# Altium footprint library Resistors_SMD_IPC-SM-782.PcbLib: 200 footprints (part 7 of 13)
Each footprint in its own frame and in the unit in brackets; x right, y up, seen from the top. Pads: shape width x height; smd on the part's side, far side on the other; paste and mask are expansions set on the pad; w line width, h text height; cw(c..) or ccw(c..) is an arc to the next point about the centre after c.
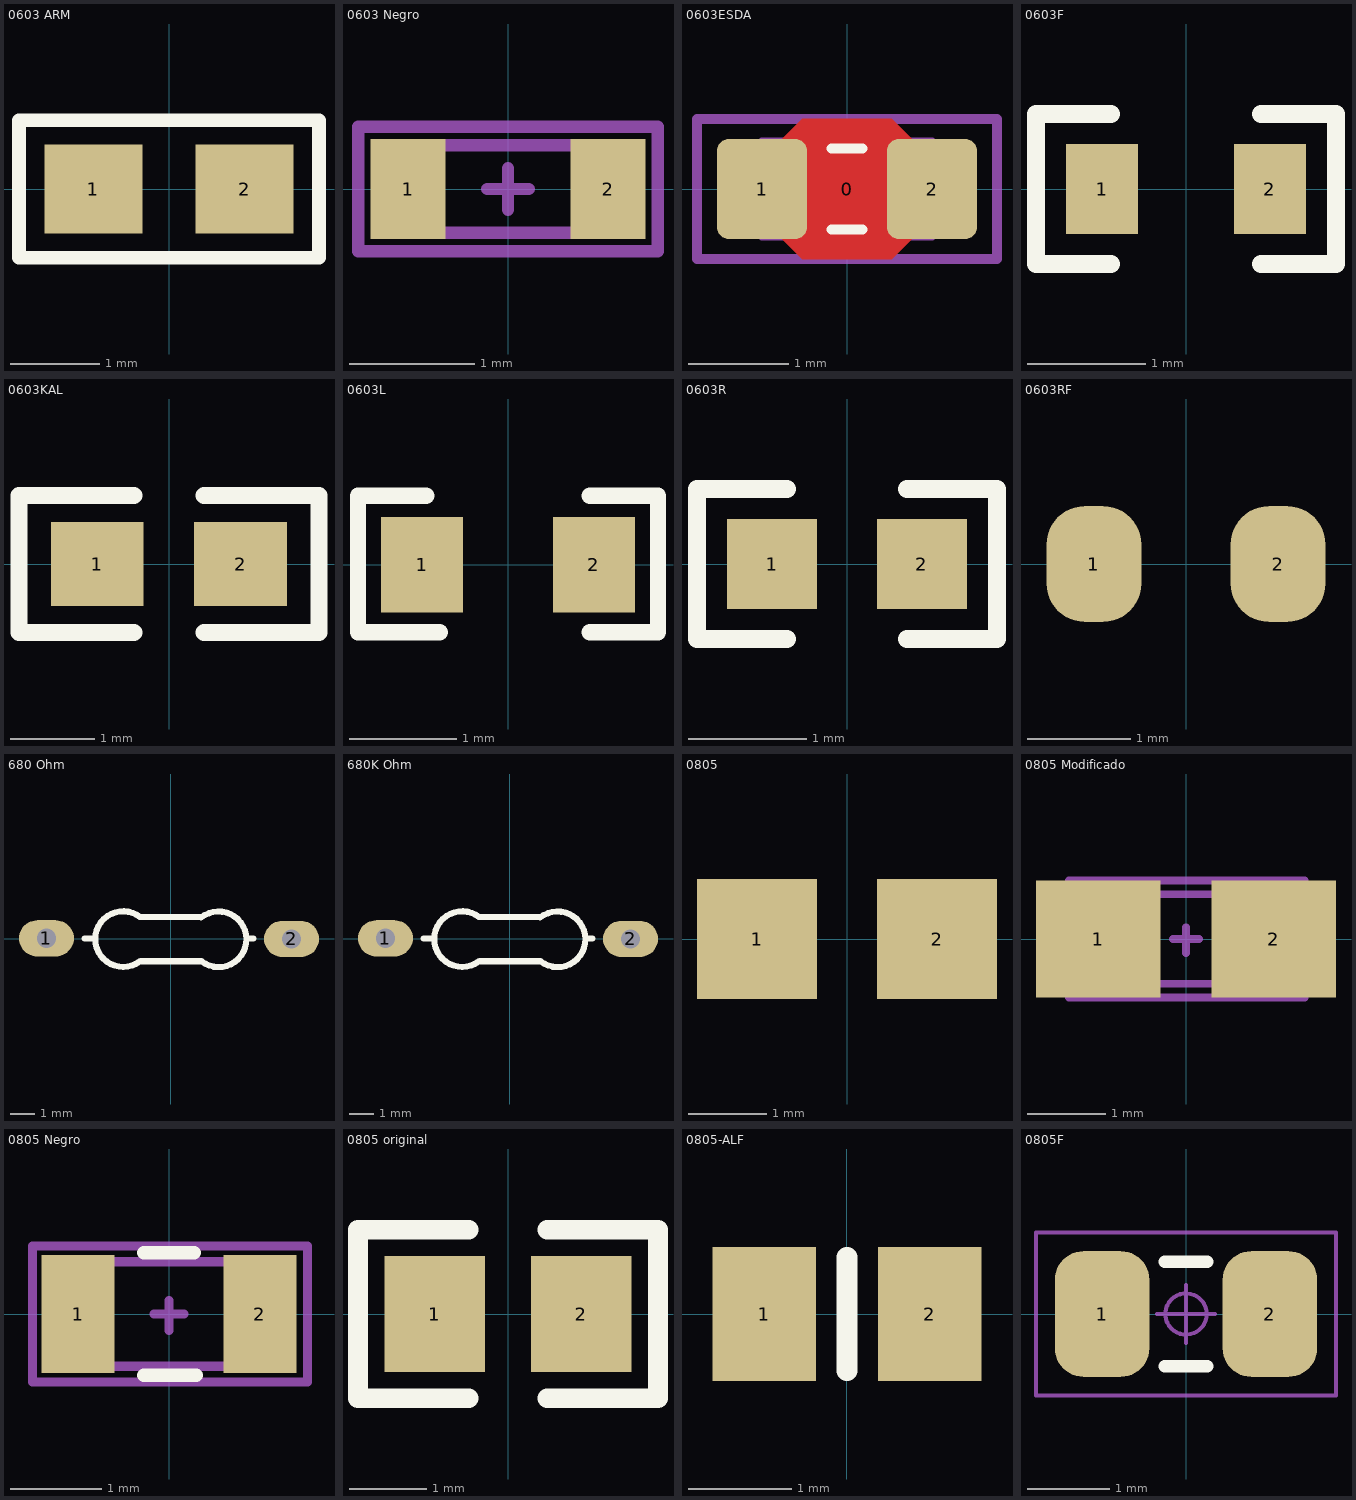
[diagram p6: the footprints below, top view; thin cyan lines are the x and y axes]

## 0603 ARM [mm]
pads (2):
  rect 1.1x1 smd: 1(-0.85,0) 2(0.85,0)
Top Overlay:
  lines w0.152: -1.684,-0.771 1.684,-0.771 1.684,0.771 -1.684,0.771 -1.684,-0.771
3D body "SW3DPS-RESISTOR 0603-DEFAULT.STEP": height 0.48, standoff -0.03, extent -0.8,-0.432 0.8,0.428

## 0603 Negro [mm] "Chip Resistor, Empaque 0603"
height 0.3
pads (2):
  rect 0.6x0.8 smd: 1(-0.8,0) 2(0.8,0)
Mechanical 13:
  lines w0.1: -0.8,-0.35 0.8,-0.35 0.8,0.35 -0.8,0.35 -0.8,-0.35
Mechanical 15:
  lines w0.1: -0.165,0 0.165,0 ; 0,-0.165 0,0.165 ; -1.2,-0.5 1.2,-0.5 1.2,0.5 -1.2,0.5 -1.2,-0.5
3D body "0603 SMD Resistor.STEP": height 0.3, standoff 0, extent -0.8,-0.4 0.8,0.4

## 0603ESDA [mm] "Chip ESD suppressor, Body 1.6x0.8mm, 0603, IPC Medium Density"
height 0.8
pads (3):
  round 0.254 on Mech15: 0(0,0)
  rrect25% 0.9x1 smd: 1(-0.85,0) 2(0.85,0)
Top Layer:
  pour cut-out: -0.65,0.5 -0.45,0.7 0.45,0.7 0.65,0.5 0.65,-0.5 0.45,-0.7 -0.45,-0.7 -0.65,-0.5
Top Overlay:
  lines w0.102: -0.152,-0.406 0.152,-0.406 ; -0.152,0.406 0.152,0.406
Mechanical 13:
  lines w0.076: -0.85,-0.475 -0.85,0.475 0.85,0.475 0.85,-0.475 -0.85,-0.475
Mechanical 15:
  lines w0.1: -1.5,-0.7 -1.5,0.7 1.5,0.7 1.5,-0.7 -1.5,-0.7
3D body "ESD Suppressor 0603 SMD.STEP": height 0.79, standoff -0.01, extent -0.85,-0.45 0.85,0.45

## 0603F [mil]
pads (2):
  rect 24x30 smd: 1(-28,0) 2(28,0)
Top Overlay:
  lines w6: -25,-25 -50,-25 -50,25 -25,25 ; 25,-25 50,-25 50,25 25,25
3D body "User Library-V0603HD.STEP": height 35.43, standoff 0, extent -31.49,-15.75 31.51,15.75

## 0603KAL [mm]
pads (2):
  rect 1.1x1.001 smd mask+0.102: 1(-0.851,0.005) 2(0.848,0.005)
Top Overlay:
  lines w0.203: -0.418,-0.807 -1.778,-0.807 -1.778,0.818 -0.418,0.818 ; 0.418,-0.807 1.778,-0.807 1.778,0.818 0.418,0.818
3D body "SW3dPS-R0603.step": height 0.37, standoff 0, extent -0.8,-0.401 0.8,0.401

## 0603L [mil]
pads (2):
  rect 30x35 smd: 1(-31.5,0) 2(31.5,0)
Top Overlay:
  lines w6: -30,25.3 -55,25.3 -55,-24.7 -25,-24.7 ; 30,-24.7 55,-24.7 55,25.3 30,25.3
3D body "User Library-Chip Inductor_0603.step": height 30.75, standoff -0.75, extent -31.5,-18.7 31.5,18.7

## 0603R [mil]
pads (2):
  rect 30x30 smd: 1(-25,0) 2(25,0)
Top Overlay:
  lines w6: -20,-25 -50,-25 -50,25 -20,25 ; 20,-25 50,-25 50,25 20,25
3D body "SW3dPS-R0603.step": height 14.72, standoff 0, extent -31.49,-15.78 31.5,15.79

## 0603RF [mil]
pads (2):
  rrect80% 36x44 smd: 1(-35,0) 2(35,0)
3D body "SW3dPS-R0603.step": height 14.72, standoff 0, extent -31.5,-16 31.5,15.57

## 680 Ohm [mm] "RESISTENCIA DE 1/4 W DE 680 OHM"
pads (2):
  oval 2.27x1.5 hole 0.8: 1(-5.125,0.025) 2(5,0)
Top Overlay:
  lines w0.254: -3.55,0.025 -3.225,0.025 ; -1.269,-0.925 cw(c-1.959,-0.005) -1.25,0.9 ; -1.248,0.9 1.25,0.9 ; -1.245,-0.925 1.286,-0.925 ; 1.265,0.881 cw(c1.985,-0.015) 1.286,-0.928 ; 3.15,0.025 3.425,0.025
3D body "SW3dPS-RESISTOR, 0.25 W, 0.4 IN LEAD PITCH.STEP": height 1.16, standoff -1.16, extent -5.56,-2.349 5.21,3.125
3D body "Res 680.STEP": height 2.93, standoff -0.91, extent -5.385,-1.168 5.385,1.143

## 680K Ohm [mm] "RESISTENCIA DE 1/4 W DE 680K OHM"
pads (2):
  oval 2.27x1.5 hole 0.8: 1(-5.125,0.025) 2(5,0)
Top Overlay:
  lines w0.254: -3.55,0.025 -3.225,0.025 ; -1.269,-0.925 cw(c-1.959,-0.005) -1.25,0.9 ; -1.248,0.9 1.25,0.9 ; -1.245,-0.925 1.286,-0.925 ; 1.265,0.881 cw(c1.985,-0.015) 1.286,-0.928 ; 3.15,0.025 3.425,0.025
3D body "SW3dPS-RESISTOR, 0.25 W, 0.4 IN LEAD PITCH.STEP": height 1.16, standoff -1.16, extent -5.56,-2.349 5.21,3.125
3D body "Res 680K.STEP": height 2.93, standoff -0.91, extent -5.385,-1.168 5.385,1.143

## 0805 [mil] "0805 case"
pads (2):
  rect 60x60 smd: 1(-45,0) 2(45,0)
3D body "R0805.step": height 18.66, standoff 0, extent -40,-25 38.74,24.29

## 0805 Modificado [mm] "Chip Resistor, Empaque 0805"
height 0.3
pads (2):
  rect 1.6x1.5 smd: 1(-1.125,0) 2(1.125,0)
Mechanical 13:
  lines w0.1: -1,-0.575 1,-0.575 1,0.575 -1,0.575 -1,-0.575
Mechanical 15:
  lines w0.1: -0.165,0 0.165,0 ; 0,-0.18 0,0.15 ; -1.5,-0.75 1.525,-0.75 1.525,0.75 -1.5,0.75 -1.5,-0.75
3D body "0805 SMD Resistor.STEP": height 0.78, standoff 0, extent -1,-0.625 1,0.625

## 0805 Negro [mm] "Chip Resistor, Empaque 0805"
height 0.3
pads (2):
  rect 0.8x1.3 smd: 1(-1,0) 2(1,0)
Top Overlay:
  lines w0.15: -0.275,-0.675 0.3,-0.675 ; -0.275,0.675 0.275,0.675
Mechanical 13:
  lines w0.1: -1,-0.575 -1,0.575 1,0.575 1,-0.575 -1,-0.575
Mechanical 15:
  lines w0.1: -0.165,0 0.165,0 ; 0,-0.18 0,0.15 ; -1.5,-0.75 -1.5,0.75 1.525,0.75 1.525,-0.75 -1.5,-0.75
3D body "0805 SMD Resistor.STEP": height 0.78, standoff 0, extent -1,-0.625 1,0.625

## 0805 original [mm]
pads (2):
  rect 1.3x1.5 smd: 1(-0.95,0) 2(0.95,0)
Top Overlay:
  lines w0.254: -0.508,-1.092 -1.943,-1.092 -1.943,1.092 -0.508,1.092 ; 0.508,-1.092 1.943,-1.092 1.943,1.092 0.508,1.092
3D body "SW3dPS-R0805.step": height 0.47, standoff 0, extent -1,-0.6 1,0.652

## 0805-ALF [mm]
pads (2):
  rect 1x1.3 smd: 1(-0.8,0) 2(0.8,0)
Top Overlay:
  lines w0.2: 0,-0.55 0,0.55
3D body "R0805.step": height 0.47, standoff 0, extent -1,-0.626 1,0.626

## 0805F [mil]
pads (2):
  rrect60% 45x60 smd mask+4: 1(-40,0) 2(40,0)
Top Overlay:
  lines w6: -10,-25 10,-25 ; -10,25 10,25
Mechanical 15:
  circle w1.97: c0,0 r9.84
  lines w1.97: -13.78,0 13.78,0 ; 0,-13.78 0,13.78 ; -71.54,-38.8 -71.54,38.8 71.53,38.8 71.54,-38.8 -71.53,-38.8
3D body "User Library-FUSER_nanoSMD.step": height 39.37, standoff 0, extent -63.09,-31.5 63.09,31.5